# Altium footprint library mastermind.PCBLIB: 1061 footprints (part 13 of 67)
Each footprint in its own frame and in the unit in brackets; x right, y up, seen from the top. Pads: shape width x height; smd on the part's side, far side on the other; paste and mask are expansions set on the pad; w line width, h text height; cw(c..) or ccw(c..) is an arc to the next point about the centre after c.
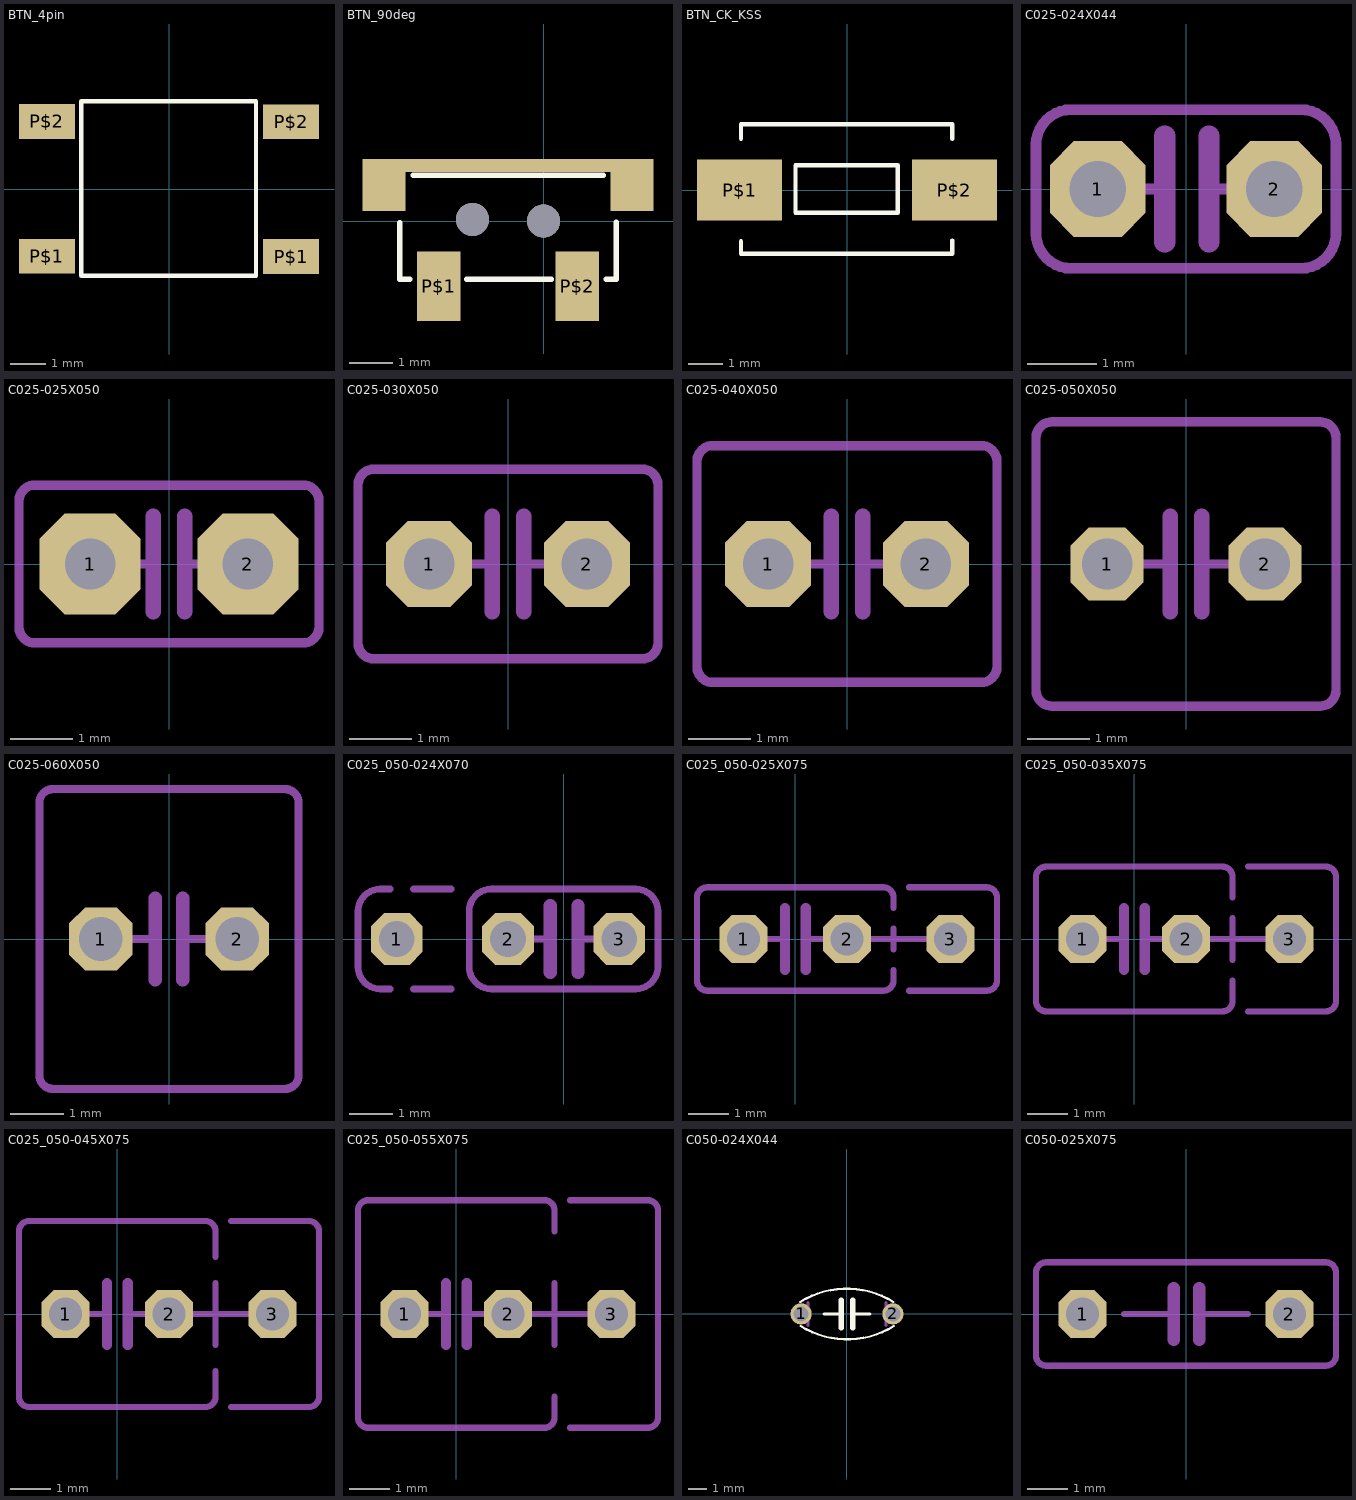
[diagram p12: the footprints below, top view; thin cyan lines are the x and y axes]

## BTN_4pin [mm]
pads (4):
  rect 1.6x1 smd: P$1(-3.492,-1.924) P$1(3.492,-1.937) P$2(-3.492,1.937) P$2(3.492,1.924)
Top Overlay:
  lines w0.127: -2.51,-2.486 2.49,-2.486 2.49,2.514 -2.51,2.514 -2.51,-2.486

## BTN_90deg [mm]
pads (7):
  rect 1x1.6 smd: P$1(-2.42,-1.505) P$2(0.78,-1.505)
  rect 1x1.2 smd: ""(-3.678,0.832) ""(2.037,0.832)
  round 0.762 hole 0.762: ""(-1.64,0.038) ""(0,0)
  rect 5x0.3 smd: ""(-0.851,1.283)
Top Overlay:
  lines w0.127: -3.32,-0.035 -3.32,-1.34 -3.085,-1.34 ; -3.006,1.06 1.372,1.06 ; -1.768,-1.34 0.178,-1.34 ; 1.445,-1.34 1.68,-1.34 1.68,-0.022

## BTN_CK_KSS [mm]
pads (2):
  rect 2.5x1.8 smd: P$1(-3.15,0) P$2(3.15,0)
Top Overlay:
  lines w0.127: -3.11,-1.5 -3.11,-1.87 3.09,-1.87 3.09,-1.48 ; -3.11,1.5 -3.11,1.93 3.09,1.93 3.09,1.5 ; -1.51,-0.67 -1.51,0.73 1.49,0.73 1.49,-0.67 -1.51,-0.67
3D body "Tactile_SMD_3x6x2.5mm.STEP": height 2.51, standoff 0, extent -4,-1.778 4.051,1.88

## C025-024X044 [mil]
pads (2):
  oct 54.22x54.22 hole 32: 1(-50,0) 2(50,0)
Mechanical 2:
  lines w6: -85,-25 ccw(c-65,-25) -65,-45 65,-45 ccw(c65,-25) 85,-25 85,25 ccw(c65,25) 65,45 -65,45 ccw(c-65,25) -85,25 -85,-25
  lines w12: -12,-30 -12,30 ; 13,-30 13,30
Mechanical 8:
  lines w6: -50,0 -12,0 ; 13,0 50,0

## C025-025X050 [mil]
pads (2):
  oct 63.9x63.9 hole 32: 1(-50,0) 2(50,0)
Mechanical 2:
  lines w6: -15,0 -10,0 ; 10,0 15,0 ; -95,-40 ccw(c-85,-40) -85,-50 85,-50 ccw(c85,-40) 95,-40 95,40 ccw(c85,40) 85,50 -85,50 ccw(c-85,40) -95,40 -95,-40
  lines w10: -10,-30 -10,0 -10,30 ; 10,-30 10,0 10,30
Mechanical 8:
  lines w6: -30,0 -15,0 ; 15,0 30,0

## C025-030X050 [mil]
pads (2):
  oct 54.22x54.22 hole 32: 1(-50,0) 2(50,0)
Mechanical 2:
  lines w6: -15,0 -10,0 ; 10,0 15,0 ; -95,-50 ccw(c-85,-50) -85,-60 85,-60 ccw(c85,-50) 95,-50 95,50 ccw(c85,50) 85,60 -85,60 ccw(c-85,50) -95,50 -95,-50
  lines w10: -10,-30 -10,0 -10,30 ; 10,-30 10,0 10,30
Mechanical 8:
  lines w6: -30,0 -15,0 ; 15,0 30,0

## C025-040X050 [mil]
pads (2):
  oct 54.22x54.22 hole 32: 1(-50,0) 2(50,0)
Mechanical 2:
  lines w6: -15,0 -10,0 ; 10,0 15,0 ; -95,-65 ccw(c-85,-65) -85,-75 85,-75 ccw(c85,-65) 95,-65 95,65 ccw(c85,65) 85,75 -85,75 ccw(c-85,65) -95,65 -95,-65
  lines w10: -10,-30 -10,0 -10,30 ; 10,-30 10,0 10,30
Mechanical 8:
  lines w6: -30,0 -15,0 ; 15,0 30,0

## C025-050X050 [mil]
pads (2):
  oct 46.48x46.48 hole 32: 1(-50,0) 2(50,0)
Mechanical 2:
  lines w6: -15,0 -10,0 ; 10,0 15,0 ; -95,-80 ccw(c-85,-80) -85,-90 85,-90 ccw(c85,-80) 95,-80 95,80 ccw(c85,80) 85,90 -85,90 ccw(c-85,80) -95,80 -95,-80
  lines w10: -10,-30 -10,0 -10,30 ; 10,-30 10,0 10,30
Mechanical 8:
  lines w6: -30,0 -15,0 ; 15,0 30,0

## C025-060X050 [mil]
pads (2):
  oct 46.48x46.48 hole 32: 1(-50,0) 2(50,0)
Mechanical 2:
  lines w6: -15,0 -10,0 ; 10,0 15,0 ; -95,-100 ccw(c-85,-100) -85,-110 85,-110 ccw(c85,-100) 95,-100 95,100 ccw(c85,100) 85,110 -85,110 ccw(c-85,100) -95,100 -95,-100
  lines w10: -10,-30 -10,0 -10,30 ; 10,-30 10,0 10,30
Mechanical 8:
  lines w6: -30,0 -15,0 ; 15,0 30,0

## C025_050-024X070 [mil]
pads (3):
  oct 46.48x46.48 hole 32: 1(-150,0) 2(-50,0) 3(50,0)
Mechanical 2:
  lines w6: -156,-45 -165,-45 cw(c-165,-25) -185,-25 -185,25 cw(c-165,25) -165,45 -156,45 ; -135,-45 -101,-45 ; -135,45 -101,45 ; -85,-25 ccw(c-65,-25) -65,-45 65,-45 ccw(c65,-25) 85,-25 ; -85,25 cw(c-65,25) -65,45 65,45 cw(c65,25) 85,25
  lines w12: -12,-30 -12,30 ; 13,-30 13,30
Mechanical 8:
  lines w6: -85,-25 -85,25 ; -50,0 -12,0 ; 13,0 50,0 ; 85,-25 85,25

## C025_050-025X075 [mil]
pads (3):
  oct 46.48x46.48 hole 32: 1(-50,0) 2(50,0) 3(150,0)
Mechanical 2:
  lines w6: -15,0 -10,0 ; 10,0 15,0 ; 90,0 110,0 ; 95,-30 95,-40 cw(c85,-40) 85,-50 -85,-50 cw(c-85,-40) -95,-40 -95,40 cw(c-85,40) -85,50 85,50 cw(c85,40) 95,40 95,30 ; 95,-10 95,10 ; 110,-50 185,-50 ccw(c185,-40) 195,-40 195,40 ccw(c185,40) 185,50 110,50
  lines w10: -10,-30 -10,0 -10,30 ; 10,-30 10,0 10,30
Mechanical 8:
  lines w6: -30,0 -15,0 ; 15,0 30,0 ; 70,0 90,0 ; 110,0 130,0

## C025_050-035X075 [mil]
pads (3):
  oct 46.48x46.48 hole 32: 1(-50,0) 2(50,0) 3(150,0)
Mechanical 2:
  lines w6: -15,0 -10,0 ; 10,0 15,0 ; 90,0 110,0 ; 95,-40 95,-60 cw(c85,-60) 85,-70 -85,-70 cw(c-85,-60) -95,-60 -95,60 cw(c-85,60) -85,70 85,70 cw(c85,60) 95,60 95,40 ; 95,-20 95,20 ; 110,-70 185,-70 ccw(c185,-60) 195,-60 195,60 ccw(c185,60) 185,70 110,70
  lines w10: -10,-30 -10,0 -10,30 ; 10,-30 10,0 10,30
Mechanical 8:
  lines w6: -30,0 -15,0 ; 15,0 30,0 ; 70,0 90,0 ; 110,0 130,0

## C025_050-045X075 [mil]
pads (3):
  oct 46.48x46.48 hole 32: 1(-50,0) 2(50,0) 3(150,0)
Mechanical 2:
  lines w6: -15,0 -10,0 ; 10,0 15,0 ; 90,0 110,0 ; 95,-55 95,-80 cw(c85,-80) 85,-90 -85,-90 cw(c-85,-80) -95,-80 -95,80 cw(c-85,80) -85,90 85,90 cw(c85,80) 95,80 95,55 ; 95,-30 95,30 ; 110,-90 185,-90 ccw(c185,-80) 195,-80 195,80 ccw(c185,80) 185,90 110,90
  lines w10: -10,-30 -10,0 -10,30 ; 10,-30 10,0 10,30
Mechanical 8:
  lines w6: -30,0 -15,0 ; 15,0 30,0 ; 70,0 90,0 ; 110,0 130,0

## C025_050-055X075 [mil]
pads (3):
  oct 46.48x46.48 hole 32: 1(-50,0) 2(50,0) 3(150,0)
Mechanical 2:
  lines w6: -15,0 -10,0 ; 10,0 15,0 ; 90,0 110,0 ; 95,-80 95,-100 cw(c85,-100) 85,-110 -85,-110 cw(c-85,-100) -95,-100 -95,100 cw(c-85,100) -85,110 85,110 cw(c85,100) 95,100 95,80 ; 95,-30 95,30 ; 110,-110 185,-110 ccw(c185,-100) 195,-100 195,100 ccw(c185,100) 185,110 110,110
  lines w10: -10,-30 -10,0 -10,30 ; 10,-30 10,0 10,30
Mechanical 8:
  lines w6: -30,0 -15,0 ; 15,0 30,0 ; 70,0 90,0 ; 110,0 130,0

## C050-024X044 [mil]
pads (2):
  round 46.48 hole 32: 1(-100,0) 2(100,0)
Top Overlay:
  lines w5: -101.97,25.98 cw(c-0.59,-135.83) 100.79,25.98 ; -100.79,-26.38 ccw(c0.59,135.44) 101.97,-26.38
  lines w6: -50,0 -12,0 ; 13,0 50,0
  lines w12: -12,-30 -12,0 -12,30 ; 13,-30 13,0 13,30
Mechanical 8:
  region: -100,-15 -100,15 -85,15 -85,-15
  region: 85,-15 85,15 100,15 100,-15
  lines w6: -85,-25 -85,25 ; 85,-25 85,25

## C050-025X075 [mil]
pads (2):
  oct 46.48x46.48 hole 32: 1(-100,0) 2(100,0)
Mechanical 2:
  lines w6: -60,0 -12,0 ; 13,0 60,0 ; -145,-40 ccw(c-135,-40) -135,-50 135,-50 ccw(c135,-40) 145,-40 145,40 ccw(c135,40) 135,50 -135,50 ccw(c-135,40) -145,40 -145,-40
  lines w12: -12,-25 -12,0 -12,25 ; 13,-25 13,0 13,25